# Altium schematic symbol library jlcpcb_2025_04_capacitors_extended_0402.schlib: 3594 symbols (part 7 of 20) (continued)
## CC0402BRNPO9BN3R9 (continued)
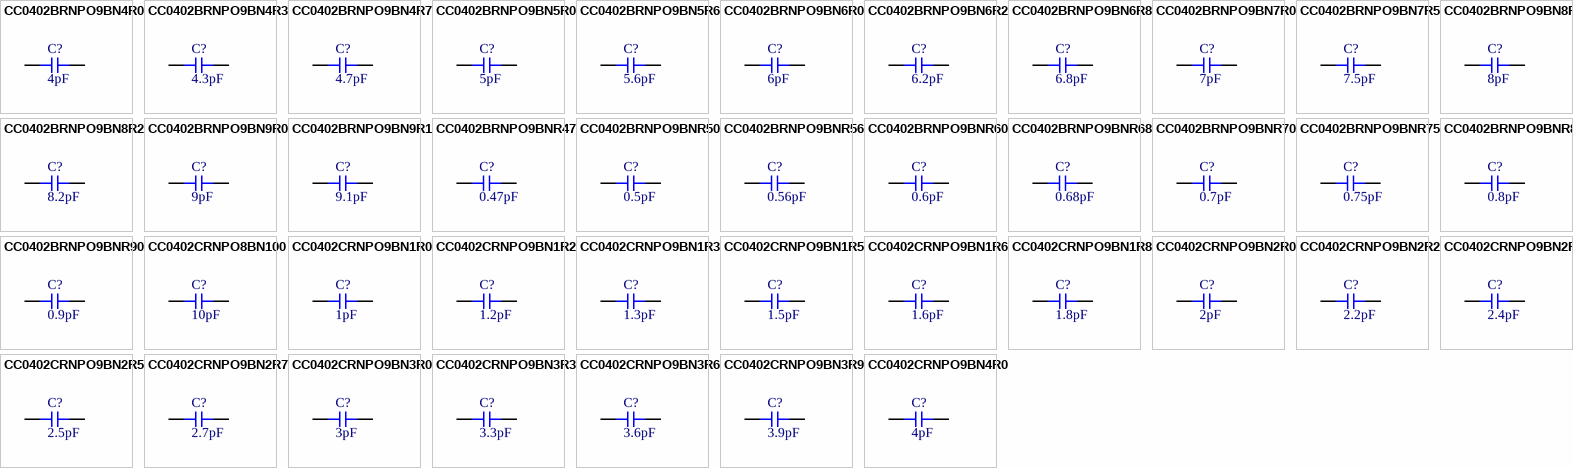
[diagram p30: symbols CC0402BRNPO9BN4R0 to CC0402CRNPO9BN4R0]

## CC0402BRNPO9BN4R0
designator C?  Capacitance: 4pF  (hidden comment: *)
Capacitor, Ceramic (MLCC), 4pF, 50V, NP0, SMD 0402; Manufacturer: YAGEO; Manufacturer Part Number: CC0402BRNPO9BN4R0; Package Size: 0402; JLCPCB Basic Part: No; JLCPCB Part Number: C541337; Supplier 1: LCSC; Category: Capacitors - MLCC; Supplier Part Number 1: C541337; Voltage Rating: 50V; Temperature Coefficient: NP0; RoHS: Yes; ComponentLink1Description: Datasheet; ComponentLink1URL: https://wmsc.lcsc.com/wmsc/upload/file/pdf/v2/lcsc/2006151111_YAGEO-CC0402BRNPO9BN4R0_C541337.pdf; ComponentLink2Description: JLCPCB Part URL; ComponentLink2URL: https://jlcpcb.com/partdetail/C541337; ComponentLink3Description: LCSC Part URL; ComponentLink3URL: https://lcsc.com/product-detail/Multilayer-Ceramic-Capacitors-MLCC---SMD-SMT_YAGEO-YAGEO-CC0402BRNPO9BN4R0_C541337.html
footprint CAP-0402 (0402 (1005M) Capacitor)
pins: 1, 2

## CC0402BRNPO9BN4R3
designator C?  Capacitance: 4.3pF  (hidden comment: *)
Capacitor, Ceramic (MLCC), 4.3pF, 50V, NP0, SMD 0402; Manufacturer: YAGEO; Manufacturer Part Number: CC0402BRNPO9BN4R3; Package Size: 0402; JLCPCB Basic Part: No; JLCPCB Part Number: C541338; Supplier 1: LCSC; Category: Capacitors - MLCC; Supplier Part Number 1: C541338; Voltage Rating: 50V; Temperature Coefficient: NP0; RoHS: Yes; ComponentLink1Description: Datasheet; ComponentLink1URL: https://wmsc.lcsc.com/wmsc/upload/file/pdf/v2/lcsc/2006151111_YAGEO-CC0402BRNPO9BN4R3_C541338.pdf; ComponentLink2Description: JLCPCB Part URL; ComponentLink2URL: https://jlcpcb.com/partdetail/C541338; ComponentLink3Description: LCSC Part URL; ComponentLink3URL: https://lcsc.com/product-detail/Multilayer-Ceramic-Capacitors-MLCC---SMD-SMT_YAGEO-YAGEO-CC0402BRNPO9BN4R3_C541338.html
footprint CAP-0402 (0402 (1005M) Capacitor)
pins: 1, 2

## CC0402BRNPO9BN4R7
designator C?  Capacitance: 4.7pF  (hidden comment: *)
Capacitor, Ceramic (MLCC), 4.7pF, 50V, NP0, SMD 0402; Manufacturer: YAGEO; Manufacturer Part Number: CC0402BRNPO9BN4R7; Package Size: 0402; JLCPCB Basic Part: No; JLCPCB Part Number: C325453; Supplier 1: LCSC; Category: Capacitors - MLCC; Supplier Part Number 1: C325453; Voltage Rating: 50V; Temperature Coefficient: NP0; RoHS: Yes; ComponentLink1Description: Datasheet; ComponentLink1URL: https://wmsc.lcsc.com/wmsc/upload/file/pdf/v2/lcsc/1811070918_YAGEO-CC0402BRNPO9BN4R7_C325453.pdf; ComponentLink2Description: JLCPCB Part URL; ComponentLink2URL: https://jlcpcb.com/partdetail/C325453; ComponentLink3Description: LCSC Part URL; ComponentLink3URL: https://lcsc.com/product-detail/Multilayer-Ceramic-Capacitors-MLCC---SMD-SMT_YAGEO-YAGEO-CC0402BRNPO9BN4R7_C325453.html
footprint CAP-0402 (0402 (1005M) Capacitor)
pins: 1, 2

## CC0402BRNPO9BN5R0
designator C?  Capacitance: 5pF  (hidden comment: *)
Capacitor, Ceramic (MLCC), 5pF, 50V, NP0, SMD 0402; Manufacturer: YAGEO; Manufacturer Part Number: CC0402BRNPO9BN5R0; Package Size: 0402; JLCPCB Basic Part: No; JLCPCB Part Number: C541339; Supplier 1: LCSC; Category: Capacitors - MLCC; Supplier Part Number 1: C541339; Voltage Rating: 50V; Temperature Coefficient: NP0; RoHS: Yes; ComponentLink1Description: Datasheet; ComponentLink1URL: https://wmsc.lcsc.com/wmsc/upload/file/pdf/v2/lcsc/2006151111_YAGEO-CC0402BRNPO9BN5R0_C541339.pdf; ComponentLink2Description: JLCPCB Part URL; ComponentLink2URL: https://jlcpcb.com/partdetail/C541339; ComponentLink3Description: LCSC Part URL; ComponentLink3URL: https://lcsc.com/product-detail/Multilayer-Ceramic-Capacitors-MLCC---SMD-SMT_YAGEO-YAGEO-CC0402BRNPO9BN5R0_C541339.html
footprint CAP-0402 (0402 (1005M) Capacitor)
pins: 1, 2

## CC0402BRNPO9BN5R6
designator C?  Capacitance: 5.6pF  (hidden comment: *)
Capacitor, Ceramic (MLCC), 5.6pF, 50V, NP0, SMD 0402; Manufacturer: YAGEO; Manufacturer Part Number: CC0402BRNPO9BN5R6; Package Size: 0402; JLCPCB Basic Part: No; JLCPCB Part Number: C505468; Supplier 1: LCSC; Category: Capacitors - MLCC; Supplier Part Number 1: C505468; Voltage Rating: 50V; Temperature Coefficient: NP0; RoHS: Yes; ComponentLink1Description: Datasheet; ComponentLink1URL: https://wmsc.lcsc.com/wmsc/upload/file/pdf/v2/lcsc/2304140030_YAGEO-CC0402BRNPO9BN5R6_C505468.pdf; ComponentLink2Description: JLCPCB Part URL; ComponentLink2URL: https://jlcpcb.com/partdetail/C505468; ComponentLink3Description: LCSC Part URL; ComponentLink3URL: https://lcsc.com/product-detail/Multilayer-Ceramic-Capacitors-MLCC---SMD-SMT_YAGEO-YAGEO-CC0402BRNPO9BN5R6_C505468.html
footprint CAP-0402 (0402 (1005M) Capacitor)
pins: 1, 2

## CC0402BRNPO9BN6R0
designator C?  Capacitance: 6pF  (hidden comment: *)
Capacitor, Ceramic (MLCC), 6pF, 50V, NP0, SMD 0402; Manufacturer: YAGEO; Manufacturer Part Number: CC0402BRNPO9BN6R0; Package Size: 0402; JLCPCB Basic Part: No; JLCPCB Part Number: C541341; Supplier 1: LCSC; Category: Capacitors - MLCC; Supplier Part Number 1: C541341; Voltage Rating: 50V; Temperature Coefficient: NP0; RoHS: Yes; ComponentLink1Description: Datasheet; ComponentLink1URL: https://wmsc.lcsc.com/wmsc/upload/file/pdf/v2/lcsc/2006151111_YAGEO-CC0402BRNPO9BN6R0_C541341.pdf; ComponentLink2Description: JLCPCB Part URL; ComponentLink2URL: https://jlcpcb.com/partdetail/C541341; ComponentLink3Description: LCSC Part URL; ComponentLink3URL: https://lcsc.com/product-detail/Multilayer-Ceramic-Capacitors-MLCC---SMD-SMT_YAGEO-YAGEO-CC0402BRNPO9BN6R0_C541341.html
footprint CAP-0402 (0402 (1005M) Capacitor)
pins: 1, 2

## CC0402BRNPO9BN6R2
designator C?  Capacitance: 6.2pF  (hidden comment: *)
Capacitor, Ceramic (MLCC), 6.2pF, 50V, NP0, SMD 0402; Manufacturer: YAGEO; Manufacturer Part Number: CC0402BRNPO9BN6R2; Package Size: 0402; JLCPCB Basic Part: No; JLCPCB Part Number: C541342; Supplier 1: LCSC; Category: Capacitors - MLCC; Supplier Part Number 1: C541342; Voltage Rating: 50V; Temperature Coefficient: NP0; RoHS: Yes; ComponentLink1Description: Datasheet; ComponentLink1URL: https://wmsc.lcsc.com/wmsc/upload/file/pdf/v2/lcsc/2006151111_YAGEO-CC0402BRNPO9BN6R2_C541342.pdf; ComponentLink2Description: JLCPCB Part URL; ComponentLink2URL: https://jlcpcb.com/partdetail/C541342; ComponentLink3Description: LCSC Part URL; ComponentLink3URL: https://lcsc.com/product-detail/Multilayer-Ceramic-Capacitors-MLCC---SMD-SMT_YAGEO-YAGEO-CC0402BRNPO9BN6R2_C541342.html
footprint CAP-0402 (0402 (1005M) Capacitor)
pins: 1, 2

## CC0402BRNPO9BN6R8
designator C?  Capacitance: 6.8pF  (hidden comment: *)
Capacitor, Ceramic (MLCC), 6.8pF, 50V, NP0, SMD 0402; Manufacturer: YAGEO; Manufacturer Part Number: CC0402BRNPO9BN6R8; Package Size: 0402; JLCPCB Basic Part: No; JLCPCB Part Number: C327291; Supplier 1: LCSC; Category: Capacitors - MLCC; Supplier Part Number 1: C327291; Voltage Rating: 50V; Temperature Coefficient: NP0; RoHS: Yes; ComponentLink1Description: Datasheet; ComponentLink1URL: https://wmsc.lcsc.com/wmsc/upload/file/pdf/v2/lcsc/1811141225_YAGEO-CC0402BRNPO9BN6R8_C327291.pdf; ComponentLink2Description: JLCPCB Part URL; ComponentLink2URL: https://jlcpcb.com/partdetail/C327291; ComponentLink3Description: LCSC Part URL; ComponentLink3URL: https://lcsc.com/product-detail/Multilayer-Ceramic-Capacitors-MLCC---SMD-SMT_YAGEO-YAGEO-CC0402BRNPO9BN6R8_C327291.html
footprint CAP-0402 (0402 (1005M) Capacitor)
pins: 1, 2

## CC0402BRNPO9BN7R0
designator C?  Capacitance: 7pF  (hidden comment: *)
Capacitor, Ceramic (MLCC), 7pF, 50V, NP0, SMD 0402; Manufacturer: YAGEO; Manufacturer Part Number: CC0402BRNPO9BN7R0; Package Size: 0402; JLCPCB Basic Part: No; JLCPCB Part Number: C541343; Supplier 1: LCSC; Category: Capacitors - MLCC; Supplier Part Number 1: C541343; Voltage Rating: 50V; Temperature Coefficient: NP0; RoHS: Yes; ComponentLink1Description: Datasheet; ComponentLink1URL: https://wmsc.lcsc.com/wmsc/upload/file/pdf/v2/lcsc/2006151111_YAGEO-CC0402BRNPO9BN7R0_C541343.pdf; ComponentLink2Description: JLCPCB Part URL; ComponentLink2URL: https://jlcpcb.com/partdetail/C541343; ComponentLink3Description: LCSC Part URL; ComponentLink3URL: https://lcsc.com/product-detail/Multilayer-Ceramic-Capacitors-MLCC---SMD-SMT_YAGEO-YAGEO-CC0402BRNPO9BN7R0_C541343.html
footprint CAP-0402 (0402 (1005M) Capacitor)
pins: 1, 2

## CC0402BRNPO9BN7R5
designator C?  Capacitance: 7.5pF  (hidden comment: *)
Capacitor, Ceramic (MLCC), 7.5pF, 50V, NP0, SMD 0402; Manufacturer: YAGEO; Manufacturer Part Number: CC0402BRNPO9BN7R5; Package Size: 0402; JLCPCB Basic Part: No; JLCPCB Part Number: C526970; Supplier 1: LCSC; Category: Capacitors - MLCC; Supplier Part Number 1: C526970; Voltage Rating: 50V; Temperature Coefficient: NP0; RoHS: Yes; ComponentLink1Description: Datasheet; ComponentLink1URL: https://wmsc.lcsc.com/wmsc/upload/file/pdf/v2/lcsc/2006101834_YAGEO-CC0402BRNPO9BN7R5_C526970.pdf; ComponentLink2Description: JLCPCB Part URL; ComponentLink2URL: https://jlcpcb.com/partdetail/C526970; ComponentLink3Description: LCSC Part URL; ComponentLink3URL: https://lcsc.com/product-detail/Multilayer-Ceramic-Capacitors-MLCC---SMD-SMT_YAGEO-YAGEO-CC0402BRNPO9BN7R5_C526970.html
footprint CAP-0402 (0402 (1005M) Capacitor)
pins: 1, 2

## CC0402BRNPO9BN8R0
designator C?  Capacitance: 8pF  (hidden comment: *)
Capacitor, Ceramic (MLCC), 8pF, 50V, NP0, SMD 0402; Manufacturer: YAGEO; Manufacturer Part Number: CC0402BRNPO9BN8R0; Package Size: 0402; JLCPCB Basic Part: No; JLCPCB Part Number: C281765; Supplier 1: LCSC; Category: Capacitors - MLCC; Supplier Part Number 1: C281765; Voltage Rating: 50V; Temperature Coefficient: NP0; RoHS: Yes; ComponentLink1Description: Datasheet; ComponentLink1URL: https://wmsc.lcsc.com/wmsc/upload/file/pdf/v2/lcsc/2304140030_YAGEO-CC0402BRNPO9BN8R0_C281765.pdf; ComponentLink2Description: JLCPCB Part URL; ComponentLink2URL: https://jlcpcb.com/partdetail/C281765; ComponentLink3Description: LCSC Part URL; ComponentLink3URL: https://lcsc.com/product-detail/Multilayer-Ceramic-Capacitors-MLCC---SMD-SMT_YAGEO-YAGEO-CC0402BRNPO9BN8R0_C281765.html
footprint CAP-0402 (0402 (1005M) Capacitor)
pins: 1, 2

## CC0402BRNPO9BN8R2
designator C?  Capacitance: 8.2pF  (hidden comment: *)
Capacitor, Ceramic (MLCC), 8.2pF, 50V, NP0, SMD 0402; Manufacturer: YAGEO; Manufacturer Part Number: CC0402BRNPO9BN8R2; Package Size: 0402; JLCPCB Basic Part: No; JLCPCB Part Number: C327205; Supplier 1: LCSC; Category: Capacitors - MLCC; Supplier Part Number 1: C327205; Voltage Rating: 50V; Temperature Coefficient: NP0; RoHS: Yes; ComponentLink1Description: Datasheet; ComponentLink1URL: https://wmsc.lcsc.com/wmsc/upload/file/pdf/v2/lcsc/1811141233_YAGEO-CC0402BRNPO9BN8R2_C327205.pdf; ComponentLink2Description: JLCPCB Part URL; ComponentLink2URL: https://jlcpcb.com/partdetail/C327205; ComponentLink3Description: LCSC Part URL; ComponentLink3URL: https://lcsc.com/product-detail/Multilayer-Ceramic-Capacitors-MLCC---SMD-SMT_YAGEO-YAGEO-CC0402BRNPO9BN8R2_C327205.html
footprint CAP-0402 (0402 (1005M) Capacitor)
pins: 1, 2

## CC0402BRNPO9BN9R0
designator C?  Capacitance: 9pF  (hidden comment: *)
Capacitor, Ceramic (MLCC), 9pF, 50V, NP0, SMD 0402; Manufacturer: YAGEO; Manufacturer Part Number: CC0402BRNPO9BN9R0; Package Size: 0402; JLCPCB Basic Part: No; JLCPCB Part Number: C526971; Supplier 1: LCSC; Category: Capacitors - MLCC; Supplier Part Number 1: C526971; Voltage Rating: 50V; Temperature Coefficient: NP0; RoHS: Yes; ComponentLink1Description: Datasheet; ComponentLink1URL: https://wmsc.lcsc.com/wmsc/upload/file/pdf/v2/lcsc/2006101834_YAGEO-CC0402BRNPO9BN9R0_C526971.pdf; ComponentLink2Description: JLCPCB Part URL; ComponentLink2URL: https://jlcpcb.com/partdetail/C526971; ComponentLink3Description: LCSC Part URL; ComponentLink3URL: https://lcsc.com/product-detail/Multilayer-Ceramic-Capacitors-MLCC---SMD-SMT_YAGEO-YAGEO-CC0402BRNPO9BN9R0_C526971.html
footprint CAP-0402 (0402 (1005M) Capacitor)
pins: 1, 2

## CC0402BRNPO9BN9R1
designator C?  Capacitance: 9.1pF  (hidden comment: *)
Capacitor, Ceramic (MLCC), 9.1pF, 50V, NP0, SMD 0402; Manufacturer: YAGEO; Manufacturer Part Number: CC0402BRNPO9BN9R1; Package Size: 0402; JLCPCB Basic Part: No; JLCPCB Part Number: C526972; Supplier 1: LCSC; Category: Capacitors - MLCC; Supplier Part Number 1: C526972; Voltage Rating: 50V; Temperature Coefficient: NP0; RoHS: Yes; ComponentLink1Description: Datasheet; ComponentLink1URL: https://wmsc.lcsc.com/wmsc/upload/file/pdf/v2/lcsc/2006101834_YAGEO-CC0402BRNPO9BN9R1_C526972.pdf; ComponentLink2Description: JLCPCB Part URL; ComponentLink2URL: https://jlcpcb.com/partdetail/C526972; ComponentLink3Description: LCSC Part URL; ComponentLink3URL: https://lcsc.com/product-detail/Multilayer-Ceramic-Capacitors-MLCC---SMD-SMT_YAGEO-YAGEO-CC0402BRNPO9BN9R1_C526972.html
footprint CAP-0402 (0402 (1005M) Capacitor)
pins: 1, 2

## CC0402BRNPO9BNR47
designator C?  Capacitance: 0.47pF  (hidden comment: *)
Capacitor, Ceramic (MLCC), 0.47pF, 50V, NP0, SMD 0402; Manufacturer: YAGEO; Manufacturer Part Number: CC0402BRNPO9BNR47; Package Size: 0402; JLCPCB Basic Part: No; JLCPCB Part Number: C114389; Supplier 1: LCSC; Category: Capacitors - MLCC; Supplier Part Number 1: C114389; Voltage Rating: 50V; Temperature Coefficient: NP0; RoHS: Yes; ComponentLink1Description: Datasheet; ComponentLink1URL: https://wmsc.lcsc.com/wmsc/upload/file/pdf/v2/lcsc/2007151105_YAGEO-CC0402BRNPO9BNR47_C114389.pdf; ComponentLink2Description: JLCPCB Part URL; ComponentLink2URL: https://jlcpcb.com/partdetail/C114389; ComponentLink3Description: LCSC Part URL; ComponentLink3URL: https://lcsc.com/product-detail/Multilayer-Ceramic-Capacitors-MLCC---SMD-SMT_YAGEO-YAGEO-CC0402BRNPO9BNR47_C114389.html
footprint CAP-0402 (0402 (1005M) Capacitor)
pins: 1, 2

## CC0402BRNPO9BNR50
designator C?  Capacitance: 0.5pF  (hidden comment: *)
Capacitor, Ceramic (MLCC), 0.5pF, 50V, NP0, SMD 0402; Manufacturer: YAGEO; Manufacturer Part Number: CC0402BRNPO9BNR50; Package Size: 0402; JLCPCB Basic Part: No; JLCPCB Part Number: C309456; Supplier 1: LCSC; Category: Capacitors - MLCC; Supplier Part Number 1: C309456; Voltage Rating: 50V; Temperature Coefficient: NP0; RoHS: Yes; ComponentLink1Description: Datasheet; ComponentLink1URL: https://wmsc.lcsc.com/wmsc/upload/file/pdf/v2/lcsc/2304140030_YAGEO-CC0402BRNPO9BNR50_C309456.pdf; ComponentLink2Description: JLCPCB Part URL; ComponentLink2URL: https://jlcpcb.com/partdetail/C309456; ComponentLink3Description: LCSC Part URL; ComponentLink3URL: https://lcsc.com/product-detail/Multilayer-Ceramic-Capacitors-MLCC---SMD-SMT_YAGEO-YAGEO-CC0402BRNPO9BNR50_C309456.html
footprint CAP-0402 (0402 (1005M) Capacitor)
pins: 1, 2

## CC0402BRNPO9BNR56
designator C?  Capacitance: 0.56pF  (hidden comment: *)
Capacitor, Ceramic (MLCC), 0.56pF, 50V, NP0, SMD 0402; Manufacturer: YAGEO; Manufacturer Part Number: CC0402BRNPO9BNR56; Package Size: 0402; JLCPCB Basic Part: No; JLCPCB Part Number: C541331; Supplier 1: LCSC; Category: Capacitors - MLCC; Supplier Part Number 1: C541331; Voltage Rating: 50V; Temperature Coefficient: NP0; RoHS: Yes; ComponentLink1Description: Datasheet; ComponentLink1URL: https://wmsc.lcsc.com/wmsc/upload/file/pdf/v2/lcsc/2006151111_YAGEO-CC0402BRNPO9BNR56_C541331.pdf; ComponentLink2Description: JLCPCB Part URL; ComponentLink2URL: https://jlcpcb.com/partdetail/C541331; ComponentLink3Description: LCSC Part URL; ComponentLink3URL: https://lcsc.com/product-detail/Multilayer-Ceramic-Capacitors-MLCC---SMD-SMT_YAGEO-YAGEO-CC0402BRNPO9BNR56_C541331.html
footprint CAP-0402 (0402 (1005M) Capacitor)
pins: 1, 2

## CC0402BRNPO9BNR60
designator C?  Capacitance: 0.6pF  (hidden comment: *)
Capacitor, Ceramic (MLCC), 0.6pF, 50V, NP0, SMD 0402; Manufacturer: YAGEO; Manufacturer Part Number: CC0402BRNPO9BNR60; Package Size: 0402; JLCPCB Basic Part: No; JLCPCB Part Number: C327237; Supplier 1: LCSC; Category: Capacitors - MLCC; Supplier Part Number 1: C327237; Voltage Rating: 50V; Temperature Coefficient: NP0; RoHS: Yes; ComponentLink1Description: Datasheet; ComponentLink1URL: https://wmsc.lcsc.com/wmsc/upload/file/pdf/v2/lcsc/1811141242_YAGEO-CC0402BRNPO9BNR60_C327237.pdf; ComponentLink2Description: JLCPCB Part URL; ComponentLink2URL: https://jlcpcb.com/partdetail/C327237; ComponentLink3Description: LCSC Part URL; ComponentLink3URL: https://lcsc.com/product-detail/Multilayer-Ceramic-Capacitors-MLCC---SMD-SMT_YAGEO-YAGEO-CC0402BRNPO9BNR60_C327237.html
footprint CAP-0402 (0402 (1005M) Capacitor)
pins: 1, 2

## CC0402BRNPO9BNR68
designator C?  Capacitance: 0.68pF  (hidden comment: *)
Capacitor, Ceramic (MLCC), 0.68pF, 50V, NP0, SMD 0402; Manufacturer: YAGEO; Manufacturer Part Number: CC0402BRNPO9BNR68; Package Size: 0402; JLCPCB Basic Part: No; JLCPCB Part Number: C327223; Supplier 1: LCSC; Category: Capacitors - MLCC; Supplier Part Number 1: C327223; Voltage Rating: 50V; Temperature Coefficient: NP0; RoHS: Yes; ComponentLink1Description: Datasheet; ComponentLink1URL: https://wmsc.lcsc.com/wmsc/upload/file/pdf/v2/lcsc/2304140030_YAGEO-CC0402BRNPO9BNR68_C327223.pdf; ComponentLink2Description: JLCPCB Part URL; ComponentLink2URL: https://jlcpcb.com/partdetail/C327223; ComponentLink3Description: LCSC Part URL; ComponentLink3URL: https://lcsc.com/product-detail/Multilayer-Ceramic-Capacitors-MLCC---SMD-SMT_YAGEO-YAGEO-CC0402BRNPO9BNR68_C327223.html
footprint CAP-0402 (0402 (1005M) Capacitor)
pins: 1, 2

## CC0402BRNPO9BNR70
designator C?  Capacitance: 0.7pF  (hidden comment: *)
Capacitor, Ceramic (MLCC), 0.7pF, 50V, NP0, SMD 0402; Manufacturer: YAGEO; Manufacturer Part Number: CC0402BRNPO9BNR70; Package Size: 0402; JLCPCB Basic Part: No; JLCPCB Part Number: C541344; Supplier 1: LCSC; Category: Capacitors - MLCC; Supplier Part Number 1: C541344; Voltage Rating: 50V; Temperature Coefficient: NP0; RoHS: Yes; ComponentLink1Description: Datasheet; ComponentLink1URL: https://wmsc.lcsc.com/wmsc/upload/file/pdf/v2/lcsc/2006151111_YAGEO-CC0402BRNPO9BNR70_C541344.pdf; ComponentLink2Description: JLCPCB Part URL; ComponentLink2URL: https://jlcpcb.com/partdetail/C541344; ComponentLink3Description: LCSC Part URL; ComponentLink3URL: https://lcsc.com/product-detail/Multilayer-Ceramic-Capacitors-MLCC---SMD-SMT_YAGEO-YAGEO-CC0402BRNPO9BNR70_C541344.html
footprint CAP-0402 (0402 (1005M) Capacitor)
pins: 1, 2

## CC0402BRNPO9BNR75
designator C?  Capacitance: 0.75pF  (hidden comment: *)
Capacitor, Ceramic (MLCC), 0.75pF, 50V, NP0, SMD 0402; Manufacturer: YAGEO; Manufacturer Part Number: CC0402BRNPO9BNR75; Package Size: 0402; JLCPCB Basic Part: No; JLCPCB Part Number: C277523; Supplier 1: LCSC; Category: Capacitors - MLCC; Supplier Part Number 1: C277523; Voltage Rating: 50V; Temperature Coefficient: NP0; RoHS: Yes; ComponentLink1Description: Datasheet; ComponentLink1URL: https://wmsc.lcsc.com/wmsc/upload/file/pdf/v2/lcsc/2304140030_YAGEO-CC0402BRNPO9BNR75_C277523.pdf; ComponentLink2Description: JLCPCB Part URL; ComponentLink2URL: https://jlcpcb.com/partdetail/C277523; ComponentLink3Description: LCSC Part URL; ComponentLink3URL: https://lcsc.com/product-detail/Multilayer-Ceramic-Capacitors-MLCC---SMD-SMT_YAGEO-YAGEO-CC0402BRNPO9BNR75_C277523.html
footprint CAP-0402 (0402 (1005M) Capacitor)
pins: 1, 2

## CC0402BRNPO9BNR80
designator C?  Capacitance: 0.8pF  (hidden comment: *)
Capacitor, Ceramic (MLCC), 0.8pF, 50V, SMD 0402; Manufacturer: YAGEO; Manufacturer Part Number: CC0402BRNPO9BNR80; Package Size: 0402; JLCPCB Basic Part: No; JLCPCB Part Number: C327032; Supplier 1: LCSC; Category: Capacitors - MLCC; Supplier Part Number 1: C327032; Voltage Rating: 50V; RoHS: Yes; ComponentLink1Description: Datasheet; ComponentLink1URL: https://wmsc.lcsc.com/wmsc/upload/file/pdf/v2/lcsc/1811141241_YAGEO-CC0402BRNPO9BNR80_C327032.pdf; ComponentLink2Description: JLCPCB Part URL; ComponentLink2URL: https://jlcpcb.com/partdetail/C327032; ComponentLink3Description: LCSC Part URL; ComponentLink3URL: https://lcsc.com/product-detail/Multilayer-Ceramic-Capacitors-MLCC---SMD-SMT_YAGEO-YAGEO-CC0402BRNPO9BNR80_C327032.html
footprint CAP-0402 (0402 (1005M) Capacitor)
pins: 1, 2

## CC0402BRNPO9BNR90
designator C?  Capacitance: 0.9pF  (hidden comment: *)
Capacitor, Ceramic (MLCC), 0.9pF, 50V, NP0, SMD 0402; Manufacturer: YAGEO; Manufacturer Part Number: CC0402BRNPO9BNR90; Package Size: 0402; JLCPCB Basic Part: No; JLCPCB Part Number: C541345; Supplier 1: LCSC; Category: Capacitors - MLCC; Supplier Part Number 1: C541345; Voltage Rating: 50V; Temperature Coefficient: NP0; RoHS: Yes; ComponentLink1Description: Datasheet; ComponentLink1URL: https://wmsc.lcsc.com/wmsc/upload/file/pdf/v2/lcsc/2006151111_YAGEO-CC0402BRNPO9BNR90_C541345.pdf; ComponentLink2Description: JLCPCB Part URL; ComponentLink2URL: https://jlcpcb.com/partdetail/C541345; ComponentLink3Description: LCSC Part URL; ComponentLink3URL: https://lcsc.com/product-detail/Multilayer-Ceramic-Capacitors-MLCC---SMD-SMT_YAGEO-YAGEO-CC0402BRNPO9BNR90_C541345.html
footprint CAP-0402 (0402 (1005M) Capacitor)
pins: 1, 2

## CC0402CRNPO8BN100
designator C?  Capacitance: 10pF  (hidden comment: *)
Capacitor, Ceramic (MLCC), 10pF, 25V, NP0, SMD 0402; Manufacturer: YAGEO; Manufacturer Part Number: CC0402CRNPO8BN100; Package Size: 0402; JLCPCB Basic Part: No; JLCPCB Part Number: C526973; Supplier 1: LCSC; Category: Capacitors - MLCC; Supplier Part Number 1: C526973; Voltage Rating: 25V; Temperature Coefficient: NP0; RoHS: Yes; ComponentLink1Description: Datasheet; ComponentLink1URL: https://wmsc.lcsc.com/wmsc/upload/file/pdf/v2/lcsc/2006241834_YAGEO-CC0402CRNPO8BN100_C526973.pdf; ComponentLink2Description: JLCPCB Part URL; ComponentLink2URL: https://jlcpcb.com/partdetail/C526973; ComponentLink3Description: LCSC Part URL; ComponentLink3URL: https://lcsc.com/product-detail/Multilayer-Ceramic-Capacitors-MLCC---SMD-SMT_YAGEO-YAGEO-CC0402CRNPO8BN100_C526973.html
footprint CAP-0402 (0402 (1005M) Capacitor)
pins: 1, 2

## CC0402CRNPO9BN1R0
designator C?  Capacitance: 1pF  (hidden comment: *)
Capacitor, Ceramic (MLCC), 1pF, 50V, SMD 0402; Manufacturer: YAGEO; Manufacturer Part Number: CC0402CRNPO9BN1R0; Package Size: 0402; JLCPCB Basic Part: No; JLCPCB Part Number: C277493; Supplier 1: LCSC; Category: Capacitors - MLCC; Supplier Part Number 1: C277493; Voltage Rating: 50V; RoHS: Yes; ComponentLink1Description: Datasheet; ComponentLink1URL: https://wmsc.lcsc.com/wmsc/upload/file/pdf/v2/lcsc/2304140030_YAGEO-CC0402CRNPO9BN1R0_C277493.pdf; ComponentLink2Description: JLCPCB Part URL; ComponentLink2URL: https://jlcpcb.com/partdetail/C277493; ComponentLink3Description: LCSC Part URL; ComponentLink3URL: https://lcsc.com/product-detail/Multilayer-Ceramic-Capacitors-MLCC---SMD-SMT_YAGEO-YAGEO-CC0402CRNPO9BN1R0_C277493.html
footprint CAP-0402 (0402 (1005M) Capacitor)
pins: 1, 2

## CC0402CRNPO9BN1R2
designator C?  Capacitance: 1.2pF  (hidden comment: *)
Capacitor, Ceramic (MLCC), 1.2pF, 50V, NP0, SMD 0402; Manufacturer: YAGEO; Manufacturer Part Number: CC0402CRNPO9BN1R2; Package Size: 0402; JLCPCB Basic Part: No; JLCPCB Part Number: C277490; Supplier 1: LCSC; Category: Capacitors - MLCC; Supplier Part Number 1: C277490; Voltage Rating: 50V; Temperature Coefficient: NP0; RoHS: Yes; ComponentLink1Description: Datasheet; ComponentLink1URL: https://wmsc.lcsc.com/wmsc/upload/file/pdf/v2/lcsc/2304140030_YAGEO-CC0402CRNPO9BN1R2_C277490.pdf; ComponentLink2Description: JLCPCB Part URL; ComponentLink2URL: https://jlcpcb.com/partdetail/C277490; ComponentLink3Description: LCSC Part URL; ComponentLink3URL: https://lcsc.com/product-detail/Multilayer-Ceramic-Capacitors-MLCC---SMD-SMT_YAGEO-YAGEO-CC0402CRNPO9BN1R2_C277490.html
footprint CAP-0402 (0402 (1005M) Capacitor)
pins: 1, 2

## CC0402CRNPO9BN1R3
designator C?  Capacitance: 1.3pF  (hidden comment: *)
Capacitor, Ceramic (MLCC), 1.3pF, 50V, NP0, SMD 0402; Manufacturer: YAGEO; Manufacturer Part Number: CC0402CRNPO9BN1R3; Package Size: 0402; JLCPCB Basic Part: No; JLCPCB Part Number: C541349; Supplier 1: LCSC; Category: Capacitors - MLCC; Supplier Part Number 1: C541349; Voltage Rating: 50V; Temperature Coefficient: NP0; RoHS: Yes; ComponentLink1Description: Datasheet; ComponentLink1URL: https://wmsc.lcsc.com/wmsc/upload/file/pdf/v2/lcsc/2006151111_YAGEO-CC0402CRNPO9BN1R3_C541349.pdf; ComponentLink2Description: JLCPCB Part URL; ComponentLink2URL: https://jlcpcb.com/partdetail/C541349; ComponentLink3Description: LCSC Part URL; ComponentLink3URL: https://lcsc.com/product-detail/Multilayer-Ceramic-Capacitors-MLCC---SMD-SMT_YAGEO-YAGEO-CC0402CRNPO9BN1R3_C541349.html
footprint CAP-0402 (0402 (1005M) Capacitor)
pins: 1, 2

## CC0402CRNPO9BN1R5
designator C?  Capacitance: 1.5pF  (hidden comment: *)
Capacitor, Ceramic (MLCC), 1.5pF, 50V, NP0, SMD 0402; Manufacturer: YAGEO; Manufacturer Part Number: CC0402CRNPO9BN1R5; Package Size: 0402; JLCPCB Basic Part: No; JLCPCB Part Number: C189471; Supplier 1: LCSC; Category: Capacitors - MLCC; Supplier Part Number 1: C189471; Voltage Rating: 50V; Temperature Coefficient: NP0; RoHS: Yes; ComponentLink1Description: Datasheet; ComponentLink1URL: https://wmsc.lcsc.com/wmsc/upload/file/pdf/v2/lcsc/2304140030_YAGEO-CC0402CRNPO9BN1R5_C189471.pdf; ComponentLink2Description: JLCPCB Part URL; ComponentLink2URL: https://jlcpcb.com/partdetail/C189471; ComponentLink3Description: LCSC Part URL; ComponentLink3URL: https://lcsc.com/product-detail/Multilayer-Ceramic-Capacitors-MLCC---SMD-SMT_YAGEO-YAGEO-CC0402CRNPO9BN1R5_C189471.html
footprint CAP-0402 (0402 (1005M) Capacitor)
pins: 1, 2

## CC0402CRNPO9BN1R6
designator C?  Capacitance: 1.6pF  (hidden comment: *)
Capacitor, Ceramic (MLCC), 1.6pF, 50V, NP0, SMD 0402; Manufacturer: YAGEO; Manufacturer Part Number: CC0402CRNPO9BN1R6; Package Size: 0402; JLCPCB Basic Part: No; JLCPCB Part Number: C541350; Supplier 1: LCSC; Category: Capacitors - MLCC; Supplier Part Number 1: C541350; Voltage Rating: 50V; Temperature Coefficient: NP0; RoHS: Yes; ComponentLink1Description: Datasheet; ComponentLink1URL: https://wmsc.lcsc.com/wmsc/upload/file/pdf/v2/lcsc/2006151111_YAGEO-CC0402CRNPO9BN1R6_C541350.pdf; ComponentLink2Description: JLCPCB Part URL; ComponentLink2URL: https://jlcpcb.com/partdetail/C541350; ComponentLink3Description: LCSC Part URL; ComponentLink3URL: https://lcsc.com/product-detail/Multilayer-Ceramic-Capacitors-MLCC---SMD-SMT_YAGEO-YAGEO-CC0402CRNPO9BN1R6_C541350.html
footprint CAP-0402 (0402 (1005M) Capacitor)
pins: 1, 2

## CC0402CRNPO9BN1R8
designator C?  Capacitance: 1.8pF  (hidden comment: *)
Capacitor, Ceramic (MLCC), 1.8pF, 50V, NP0, SMD 0402; Manufacturer: YAGEO; Manufacturer Part Number: CC0402CRNPO9BN1R8; Package Size: 0402; JLCPCB Basic Part: No; JLCPCB Part Number: C272883; Supplier 1: LCSC; Category: Capacitors - MLCC; Supplier Part Number 1: C272883; Voltage Rating: 50V; Temperature Coefficient: NP0; RoHS: Yes; ComponentLink1Description: Datasheet; ComponentLink1URL: https://wmsc.lcsc.com/wmsc/upload/file/pdf/v2/lcsc/2304140030_YAGEO-CC0402CRNPO9BN1R8_C272883.pdf; ComponentLink2Description: JLCPCB Part URL; ComponentLink2URL: https://jlcpcb.com/partdetail/C272883; ComponentLink3Description: LCSC Part URL; ComponentLink3URL: https://lcsc.com/product-detail/Multilayer-Ceramic-Capacitors-MLCC---SMD-SMT_YAGEO-YAGEO-CC0402CRNPO9BN1R8_C272883.html
footprint CAP-0402 (0402 (1005M) Capacitor)
pins: 1, 2

## CC0402CRNPO9BN2R0
designator C?  Capacitance: 2pF  (hidden comment: *)
Capacitor, Ceramic (MLCC), 2pF, 50V, NP0, SMD 0402; Manufacturer: YAGEO; Manufacturer Part Number: CC0402CRNPO9BN2R0; Package Size: 0402; JLCPCB Basic Part: No; JLCPCB Part Number: C325454; Supplier 1: LCSC; Category: Capacitors - MLCC; Supplier Part Number 1: C325454; Voltage Rating: 50V; Temperature Coefficient: NP0; RoHS: Yes; ComponentLink1Description: Datasheet; ComponentLink1URL: https://wmsc.lcsc.com/wmsc/upload/file/pdf/v2/lcsc/1811070918_YAGEO-CC0402CRNPO9BN2R0_C325454.pdf; ComponentLink2Description: JLCPCB Part URL; ComponentLink2URL: https://jlcpcb.com/partdetail/C325454; ComponentLink3Description: LCSC Part URL; ComponentLink3URL: https://lcsc.com/product-detail/Multilayer-Ceramic-Capacitors-MLCC---SMD-SMT_YAGEO-YAGEO-CC0402CRNPO9BN2R0_C325454.html
footprint CAP-0402 (0402 (1005M) Capacitor)
pins: 1, 2

## CC0402CRNPO9BN2R2
designator C?  Capacitance: 2.2pF  (hidden comment: *)
Capacitor, Ceramic (MLCC), 2.2pF, 50V, NP0, SMD 0402; Manufacturer: YAGEO; Manufacturer Part Number: CC0402CRNPO9BN2R2; Package Size: 0402; JLCPCB Basic Part: No; JLCPCB Part Number: C189468; Supplier 1: LCSC; Category: Capacitors - MLCC; Supplier Part Number 1: C189468; Voltage Rating: 50V; Temperature Coefficient: NP0; RoHS: Yes; ComponentLink1Description: Datasheet; ComponentLink1URL: https://wmsc.lcsc.com/wmsc/upload/file/pdf/v2/lcsc/2304140030_YAGEO-CC0402CRNPO9BN2R2_C189468.pdf; ComponentLink2Description: JLCPCB Part URL; ComponentLink2URL: https://jlcpcb.com/partdetail/C189468; ComponentLink3Description: LCSC Part URL; ComponentLink3URL: https://lcsc.com/product-detail/Multilayer-Ceramic-Capacitors-MLCC---SMD-SMT_YAGEO-YAGEO-CC0402CRNPO9BN2R2_C189468.html
footprint CAP-0402 (0402 (1005M) Capacitor)
pins: 1, 2

## CC0402CRNPO9BN2R4
designator C?  Capacitance: 2.4pF  (hidden comment: *)
Capacitor, Ceramic (MLCC), 2.4pF, 50V, NP0, SMD 0402; Manufacturer: YAGEO; Manufacturer Part Number: CC0402CRNPO9BN2R4; Package Size: 0402; JLCPCB Basic Part: No; JLCPCB Part Number: C260623; Supplier 1: LCSC; Category: Capacitors - MLCC; Supplier Part Number 1: C260623; Voltage Rating: 50V; Temperature Coefficient: NP0; RoHS: Yes; ComponentLink1Description: Datasheet; ComponentLink1URL: https://wmsc.lcsc.com/wmsc/upload/file/pdf/v2/lcsc/2007151106_YAGEO-CC0402CRNPO9BN2R4_C260623.pdf; ComponentLink2Description: JLCPCB Part URL; ComponentLink2URL: https://jlcpcb.com/partdetail/C260623; ComponentLink3Description: LCSC Part URL; ComponentLink3URL: https://lcsc.com/product-detail/Multilayer-Ceramic-Capacitors-MLCC---SMD-SMT_YAGEO-YAGEO-CC0402CRNPO9BN2R4_C260623.html
footprint CAP-0402 (0402 (1005M) Capacitor)
pins: 1, 2

## CC0402CRNPO9BN2R5
designator C?  Capacitance: 2.5pF  (hidden comment: *)
Capacitor, Ceramic (MLCC), 2.5pF, 50V, NP0, SMD 0402; Manufacturer: YAGEO; Manufacturer Part Number: CC0402CRNPO9BN2R5; Package Size: 0402; JLCPCB Basic Part: No; JLCPCB Part Number: C541351; Supplier 1: LCSC; Category: Capacitors - MLCC; Supplier Part Number 1: C541351; Voltage Rating: 50V; Temperature Coefficient: NP0; RoHS: Yes; ComponentLink1Description: Datasheet; ComponentLink1URL: https://wmsc.lcsc.com/wmsc/upload/file/pdf/v2/lcsc/2006151111_YAGEO-CC0402CRNPO9BN2R5_C541351.pdf; ComponentLink2Description: JLCPCB Part URL; ComponentLink2URL: https://jlcpcb.com/partdetail/C541351; ComponentLink3Description: LCSC Part URL; ComponentLink3URL: https://lcsc.com/product-detail/Multilayer-Ceramic-Capacitors-MLCC---SMD-SMT_YAGEO-YAGEO-CC0402CRNPO9BN2R5_C541351.html
footprint CAP-0402 (0402 (1005M) Capacitor)
pins: 1, 2

## CC0402CRNPO9BN2R7
designator C?  Capacitance: 2.7pF  (hidden comment: *)
Capacitor, Ceramic (MLCC), 2.7pF, 50V, NP0, SMD 0402; Manufacturer: YAGEO; Manufacturer Part Number: CC0402CRNPO9BN2R7; Package Size: 0402; JLCPCB Basic Part: No; JLCPCB Part Number: C277484; Supplier 1: LCSC; Category: Capacitors - MLCC; Supplier Part Number 1: C277484; Voltage Rating: 50V; Temperature Coefficient: NP0; RoHS: Yes; ComponentLink1Description: Datasheet; ComponentLink1URL: https://wmsc.lcsc.com/wmsc/upload/file/pdf/v2/lcsc/2304140030_YAGEO-CC0402CRNPO9BN2R7_C277484.pdf; ComponentLink2Description: JLCPCB Part URL; ComponentLink2URL: https://jlcpcb.com/partdetail/C277484; ComponentLink3Description: LCSC Part URL; ComponentLink3URL: https://lcsc.com/product-detail/Multilayer-Ceramic-Capacitors-MLCC---SMD-SMT_YAGEO-YAGEO-CC0402CRNPO9BN2R7_C277484.html
footprint CAP-0402 (0402 (1005M) Capacitor)
pins: 1, 2

## CC0402CRNPO9BN3R0
designator C?  Capacitance: 3pF  (hidden comment: *)
Capacitor, Ceramic (MLCC), 3pF, 50V, NP0, SMD 0402; Manufacturer: YAGEO; Manufacturer Part Number: CC0402CRNPO9BN3R0; Package Size: 0402; JLCPCB Basic Part: No; JLCPCB Part Number: C130112; Supplier 1: LCSC; Category: Capacitors - MLCC; Supplier Part Number 1: C130112; Voltage Rating: 50V; Temperature Coefficient: NP0; RoHS: Yes; ComponentLink1Description: Datasheet; ComponentLink1URL: https://wmsc.lcsc.com/wmsc/upload/file/pdf/v2/lcsc/2304140030_YAGEO-CC0402CRNPO9BN3R0_C130112.pdf; ComponentLink2Description: JLCPCB Part URL; ComponentLink2URL: https://jlcpcb.com/partdetail/C130112; ComponentLink3Description: LCSC Part URL; ComponentLink3URL: https://lcsc.com/product-detail/Multilayer-Ceramic-Capacitors-MLCC---SMD-SMT_YAGEO-YAGEO-CC0402CRNPO9BN3R0_C130112.html
footprint CAP-0402 (0402 (1005M) Capacitor)
pins: 1, 2

## CC0402CRNPO9BN3R3
designator C?  Capacitance: 3.3pF  (hidden comment: *)
Capacitor, Ceramic (MLCC), 3.3pF, 50V, NP0, SMD 0402; Manufacturer: YAGEO; Manufacturer Part Number: CC0402CRNPO9BN3R3; Package Size: 0402; JLCPCB Basic Part: No; JLCPCB Part Number: C272872; Supplier 1: LCSC; Category: Capacitors - MLCC; Supplier Part Number 1: C272872; Voltage Rating: 50V; Temperature Coefficient: NP0; RoHS: Yes; ComponentLink1Description: Datasheet; ComponentLink1URL: https://wmsc.lcsc.com/wmsc/upload/file/pdf/v2/lcsc/2304140030_YAGEO-CC0402CRNPO9BN3R3_C272872.pdf; ComponentLink2Description: JLCPCB Part URL; ComponentLink2URL: https://jlcpcb.com/partdetail/C272872; ComponentLink3Description: LCSC Part URL; ComponentLink3URL: https://lcsc.com/product-detail/Multilayer-Ceramic-Capacitors-MLCC---SMD-SMT_YAGEO-YAGEO-CC0402CRNPO9BN3R3_C272872.html
footprint CAP-0402 (0402 (1005M) Capacitor)
pins: 1, 2

## CC0402CRNPO9BN3R6
designator C?  Capacitance: 3.6pF  (hidden comment: *)
Capacitor, Ceramic (MLCC), 3.6pF, 50V, NP0, SMD 0402; Manufacturer: YAGEO; Manufacturer Part Number: CC0402CRNPO9BN3R6; Package Size: 0402; JLCPCB Basic Part: No; JLCPCB Part Number: C326945; Supplier 1: LCSC; Category: Capacitors - MLCC; Supplier Part Number 1: C326945; Voltage Rating: 50V; Temperature Coefficient: NP0; RoHS: Yes; ComponentLink1Description: Datasheet; ComponentLink1URL: https://wmsc.lcsc.com/wmsc/upload/file/pdf/v2/lcsc/1811141241_YAGEO-CC0402CRNPO9BN3R6_C326945.pdf; ComponentLink2Description: JLCPCB Part URL; ComponentLink2URL: https://jlcpcb.com/partdetail/C326945; ComponentLink3Description: LCSC Part URL; ComponentLink3URL: https://lcsc.com/product-detail/Multilayer-Ceramic-Capacitors-MLCC---SMD-SMT_YAGEO-YAGEO-CC0402CRNPO9BN3R6_C326945.html
footprint CAP-0402 (0402 (1005M) Capacitor)
pins: 1, 2

## CC0402CRNPO9BN3R9
designator C?  Capacitance: 3.9pF  (hidden comment: *)
Capacitor, Ceramic (MLCC), 3.9pF, 50V, NP0, SMD 0402; Manufacturer: YAGEO; Manufacturer Part Number: CC0402CRNPO9BN3R9; Package Size: 0402; JLCPCB Basic Part: No; JLCPCB Part Number: C282240; Supplier 1: LCSC; Category: Capacitors - MLCC; Supplier Part Number 1: C282240; Voltage Rating: 50V; Temperature Coefficient: NP0; RoHS: Yes; ComponentLink1Description: Datasheet; ComponentLink1URL: https://wmsc.lcsc.com/wmsc/upload/file/pdf/v2/lcsc/2304140030_YAGEO-CC0402CRNPO9BN3R9_C282240.pdf; ComponentLink2Description: JLCPCB Part URL; ComponentLink2URL: https://jlcpcb.com/partdetail/C282240; ComponentLink3Description: LCSC Part URL; ComponentLink3URL: https://lcsc.com/product-detail/Multilayer-Ceramic-Capacitors-MLCC---SMD-SMT_YAGEO-YAGEO-CC0402CRNPO9BN3R9_C282240.html
footprint CAP-0402 (0402 (1005M) Capacitor)
pins: 1, 2

## CC0402CRNPO9BN4R0
designator C?  Capacitance: 4pF  (hidden comment: *)
Capacitor, Ceramic (MLCC), 4pF, 50V, NP0, SMD 0402; Manufacturer: YAGEO; Manufacturer Part Number: CC0402CRNPO9BN4R0; Package Size: 0402; JLCPCB Basic Part: No; JLCPCB Part Number: C325455; Supplier 1: LCSC; Category: Capacitors - MLCC; Supplier Part Number 1: C325455; Voltage Rating: 50V; Temperature Coefficient: NP0; RoHS: Yes; ComponentLink1Description: Datasheet; ComponentLink1URL: https://wmsc.lcsc.com/wmsc/upload/file/pdf/v2/lcsc/1912111437_YAGEO-CC0402CRNPO9BN4R0_C325455.pdf; ComponentLink2Description: JLCPCB Part URL; ComponentLink2URL: https://jlcpcb.com/partdetail/C325455; ComponentLink3Description: LCSC Part URL; ComponentLink3URL: https://lcsc.com/product-detail/Multilayer-Ceramic-Capacitors-MLCC---SMD-SMT_YAGEO-YAGEO-CC0402CRNPO9BN4R0_C325455.html
footprint CAP-0402 (0402 (1005M) Capacitor)
pins: 1, 2

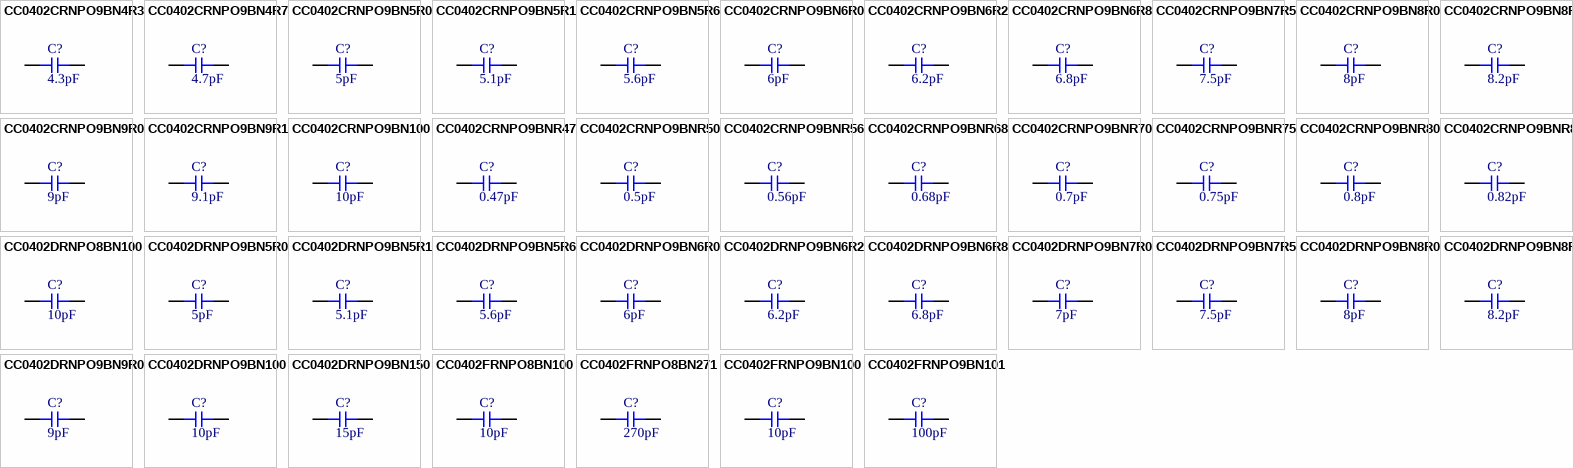
[diagram p31: symbols CC0402CRNPO9BN4R3 to CC0402FRNPO9BN101]

## CC0402CRNPO9BN4R3
designator C?  Capacitance: 4.3pF  (hidden comment: *)
Capacitor, Ceramic (MLCC), 4.3pF, 50V, NP0, SMD 0402; Manufacturer: YAGEO; Manufacturer Part Number: CC0402CRNPO9BN4R3; Package Size: 0402; JLCPCB Basic Part: No; JLCPCB Part Number: C260571; Supplier 1: LCSC; Category: Capacitors - MLCC; Supplier Part Number 1: C260571; Voltage Rating: 50V; Temperature Coefficient: NP0; RoHS: Yes; ComponentLink1Description: Datasheet; ComponentLink1URL: https://wmsc.lcsc.com/wmsc/upload/file/pdf/v2/lcsc/2007151106_YAGEO-CC0402CRNPO9BN4R3_C260571.pdf; ComponentLink2Description: JLCPCB Part URL; ComponentLink2URL: https://jlcpcb.com/partdetail/C260571; ComponentLink3Description: LCSC Part URL; ComponentLink3URL: https://lcsc.com/product-detail/Multilayer-Ceramic-Capacitors-MLCC---SMD-SMT_YAGEO-YAGEO-CC0402CRNPO9BN4R3_C260571.html
footprint CAP-0402 (0402 (1005M) Capacitor)
pins: 1, 2

## CC0402CRNPO9BN4R7
designator C?  Capacitance: 4.7pF  (hidden comment: *)
Capacitor, Ceramic (MLCC), 4.7pF, 50V, NP0, SMD 0402; Manufacturer: YAGEO; Manufacturer Part Number: CC0402CRNPO9BN4R7; Package Size: 0402; JLCPCB Basic Part: No; JLCPCB Part Number: C189469; Supplier 1: LCSC; Category: Capacitors - MLCC; Supplier Part Number 1: C189469; Voltage Rating: 50V; Temperature Coefficient: NP0; RoHS: Yes; ComponentLink1Description: Datasheet; ComponentLink1URL: https://wmsc.lcsc.com/wmsc/upload/file/pdf/v2/lcsc/2304140030_YAGEO-CC0402CRNPO9BN4R7_C189469.pdf; ComponentLink2Description: JLCPCB Part URL; ComponentLink2URL: https://jlcpcb.com/partdetail/C189469; ComponentLink3Description: LCSC Part URL; ComponentLink3URL: https://lcsc.com/product-detail/Multilayer-Ceramic-Capacitors-MLCC---SMD-SMT_YAGEO-YAGEO-CC0402CRNPO9BN4R7_C189469.html
footprint CAP-0402 (0402 (1005M) Capacitor)
pins: 1, 2

## CC0402CRNPO9BN5R0
designator C?  Capacitance: 5pF  (hidden comment: *)
Capacitor, Ceramic (MLCC), 5pF, 50V, NP0, SMD 0402; Manufacturer: YAGEO; Manufacturer Part Number: CC0402CRNPO9BN5R0; Package Size: 0402; JLCPCB Basic Part: No; JLCPCB Part Number: C130117; Supplier 1: LCSC; Category: Capacitors - MLCC; Supplier Part Number 1: C130117; Voltage Rating: 50V; Temperature Coefficient: NP0; RoHS: Yes; ComponentLink1Description: Datasheet; ComponentLink1URL: https://wmsc.lcsc.com/wmsc/upload/file/pdf/v2/lcsc/2304140030_YAGEO-CC0402CRNPO9BN5R0_C130117.pdf; ComponentLink2Description: JLCPCB Part URL; ComponentLink2URL: https://jlcpcb.com/partdetail/C130117; ComponentLink3Description: LCSC Part URL; ComponentLink3URL: https://lcsc.com/product-detail/Multilayer-Ceramic-Capacitors-MLCC---SMD-SMT_YAGEO-YAGEO-CC0402CRNPO9BN5R0_C130117.html
footprint CAP-0402 (0402 (1005M) Capacitor)
pins: 1, 2

## CC0402CRNPO9BN5R1
designator C?  Capacitance: 5.1pF  (hidden comment: *)
Capacitor, Ceramic (MLCC), 5.1pF, 50V, NP0, SMD 0402; Manufacturer: YAGEO; Manufacturer Part Number: CC0402CRNPO9BN5R1; Package Size: 0402; JLCPCB Basic Part: No; JLCPCB Part Number: C281761; Supplier 1: LCSC; Category: Capacitors - MLCC; Supplier Part Number 1: C281761; Voltage Rating: 50V; Temperature Coefficient: NP0; RoHS: Yes; ComponentLink1Description: Datasheet; ComponentLink1URL: https://wmsc.lcsc.com/wmsc/upload/file/pdf/v2/lcsc/2304140030_YAGEO-CC0402CRNPO9BN5R1_C281761.pdf; ComponentLink2Description: JLCPCB Part URL; ComponentLink2URL: https://jlcpcb.com/partdetail/C281761; ComponentLink3Description: LCSC Part URL; ComponentLink3URL: https://lcsc.com/product-detail/Multilayer-Ceramic-Capacitors-MLCC---SMD-SMT_YAGEO-YAGEO-CC0402CRNPO9BN5R1_C281761.html
footprint CAP-0402 (0402 (1005M) Capacitor)
pins: 1, 2

## CC0402CRNPO9BN5R6
designator C?  Capacitance: 5.6pF  (hidden comment: *)
Capacitor, Ceramic (MLCC), 5.6pF, 50V, NP0, SMD 0402; Manufacturer: YAGEO; Manufacturer Part Number: CC0402CRNPO9BN5R6; Package Size: 0402; JLCPCB Basic Part: No; JLCPCB Part Number: C272866; Supplier 1: LCSC; Category: Capacitors - MLCC; Supplier Part Number 1: C272866; Voltage Rating: 50V; Temperature Coefficient: NP0; RoHS: Yes; ComponentLink1Description: Datasheet; ComponentLink1URL: https://wmsc.lcsc.com/wmsc/upload/file/pdf/v2/lcsc/2304140030_YAGEO-CC0402CRNPO9BN5R6_C272866.pdf; ComponentLink2Description: JLCPCB Part URL; ComponentLink2URL: https://jlcpcb.com/partdetail/C272866; ComponentLink3Description: LCSC Part URL; ComponentLink3URL: https://lcsc.com/product-detail/Multilayer-Ceramic-Capacitors-MLCC---SMD-SMT_YAGEO-YAGEO-CC0402CRNPO9BN5R6_C272866.html
footprint CAP-0402 (0402 (1005M) Capacitor)
pins: 1, 2

## CC0402CRNPO9BN6R0
designator C?  Capacitance: 6pF  (hidden comment: *)
Capacitor, Ceramic (MLCC), 6pF, 50V, NP0, SMD 0402; Manufacturer: YAGEO; Manufacturer Part Number: CC0402CRNPO9BN6R0; Package Size: 0402; JLCPCB Basic Part: No; JLCPCB Part Number: C700515; Supplier 1: LCSC; Category: Capacitors - MLCC; Supplier Part Number 1: C700515; Voltage Rating: 50V; Temperature Coefficient: NP0; RoHS: Yes; ComponentLink1Description: Datasheet; ComponentLink1URL: https://wmsc.lcsc.com/wmsc/upload/file/pdf/v2/lcsc/2007101237_YAGEO-CC0402CRNPO9BN6R0_C700515.pdf; ComponentLink2Description: JLCPCB Part URL; ComponentLink2URL: https://jlcpcb.com/partdetail/C700515; ComponentLink3Description: LCSC Part URL; ComponentLink3URL: https://lcsc.com/product-detail/Multilayer-Ceramic-Capacitors-MLCC---SMD-SMT_YAGEO-YAGEO-CC0402CRNPO9BN6R0_C700515.html
footprint CAP-0402 (0402 (1005M) Capacitor)
pins: 1, 2

## CC0402CRNPO9BN6R2
designator C?  Capacitance: 6.2pF  (hidden comment: *)
Capacitor, Ceramic (MLCC), 6.2pF, 50V, NP0, SMD 0402; Manufacturer: YAGEO; Manufacturer Part Number: CC0402CRNPO9BN6R2; Package Size: 0402; JLCPCB Basic Part: No; JLCPCB Part Number: C325456; Supplier 1: LCSC; Category: Capacitors - MLCC; Supplier Part Number 1: C325456; Voltage Rating: 50V; Temperature Coefficient: NP0; RoHS: Yes; ComponentLink1Description: Datasheet; ComponentLink1URL: https://wmsc.lcsc.com/wmsc/upload/file/pdf/v2/lcsc/1811070918_YAGEO-CC0402CRNPO9BN6R2_C325456.pdf; ComponentLink2Description: JLCPCB Part URL; ComponentLink2URL: https://jlcpcb.com/partdetail/C325456; ComponentLink3Description: LCSC Part URL; ComponentLink3URL: https://lcsc.com/product-detail/Multilayer-Ceramic-Capacitors-MLCC---SMD-SMT_YAGEO-YAGEO-CC0402CRNPO9BN6R2_C325456.html
footprint CAP-0402 (0402 (1005M) Capacitor)
pins: 1, 2

## CC0402CRNPO9BN6R8
designator C?  Capacitance: 6.8pF  (hidden comment: *)
Capacitor, Ceramic (MLCC), 6.8pF, 50V, NP0, SMD 0402; Manufacturer: YAGEO; Manufacturer Part Number: CC0402CRNPO9BN6R8; Package Size: 0402; JLCPCB Basic Part: No; JLCPCB Part Number: C189470; Supplier 1: LCSC; Category: Capacitors - MLCC; Supplier Part Number 1: C189470; Voltage Rating: 50V; Temperature Coefficient: NP0; RoHS: Yes; ComponentLink1Description: Datasheet; ComponentLink1URL: https://wmsc.lcsc.com/wmsc/upload/file/pdf/v2/lcsc/2304140030_YAGEO-CC0402CRNPO9BN6R8_C189470.pdf; ComponentLink2Description: JLCPCB Part URL; ComponentLink2URL: https://jlcpcb.com/partdetail/C189470; ComponentLink3Description: LCSC Part URL; ComponentLink3URL: https://lcsc.com/product-detail/Multilayer-Ceramic-Capacitors-MLCC---SMD-SMT_YAGEO-YAGEO-CC0402CRNPO9BN6R8_C189470.html
footprint CAP-0402 (0402 (1005M) Capacitor)
pins: 1, 2

## CC0402CRNPO9BN7R5
designator C?  Capacitance: 7.5pF  (hidden comment: *)
Capacitor, Ceramic (MLCC), 7.5pF, 50V, NP0, SMD 0402; Manufacturer: YAGEO; Manufacturer Part Number: CC0402CRNPO9BN7R5; Package Size: 0402; JLCPCB Basic Part: No; JLCPCB Part Number: C505479; Supplier 1: LCSC; Category: Capacitors - MLCC; Supplier Part Number 1: C505479; Voltage Rating: 50V; Temperature Coefficient: NP0; RoHS: Yes; ComponentLink1Description: Datasheet; ComponentLink1URL: https://wmsc.lcsc.com/wmsc/upload/file/pdf/v2/lcsc/2003312210_YAGEO-CC0402CRNPO9BN7R5_C505479.pdf; ComponentLink2Description: JLCPCB Part URL; ComponentLink2URL: https://jlcpcb.com/partdetail/C505479; ComponentLink3Description: LCSC Part URL; ComponentLink3URL: https://lcsc.com/product-detail/Multilayer-Ceramic-Capacitors-MLCC---SMD-SMT_YAGEO-YAGEO-CC0402CRNPO9BN7R5_C505479.html
footprint CAP-0402 (0402 (1005M) Capacitor)
pins: 1, 2
